# Altium footprint library Metric_SMD.PcbLib: 185 footprints (part 1 of 12) (continued)
## BGA360_TGP [mil] "BGA360_TGP" (continued)
  round 12 smd: A5(-221,299.64) A6(-194.4,307.64) A8(-126,307.64) A10(-68.4,307.64) A13(0,307.64) A16(57.6,307.64) A18(126,307.64) A20(183.6,307.64) AA1(-299.64,-221) AA2(-272.08,-221) AA3(-244.52,-221) AB4(-220.5,-235.52) AB6(-189,-232.08) AB7(-157.5,-235.52) AB8(-107.92,-238.84) AB10(-63,-232.08) AB11(-31.5,-235.52) AB13(0,-224.96) AB15(31.5,-235.52) AB16(63,-232.08) AB17(103.2,-236.81) AB19(157.5,-235.52) AB20(189,-232.08) AB22(235.52,-220.5) AB23(263.08,-220) AB24(290.64,-217.8) AC2(-280.08,-252) AC3(-252,-252.52) AC4(-220,-263.08) AC7(-157.5,-263.08) AC8(-131.65,-252.93) AC9(-94,-263.08) AC11(-31.5,-263.08) AC13(0,-252.52) AC15(32,-263.08) AC17(94.5,-263.08) AC18(126,-252.52) AC19(158,-263.08) AC21(221,-244.52) AC23(252.52,-252) AC24(280.08,-252) AD3(-252,-280.08) AD4(-217.8,-290.64) AD6(-183.6,-280.08) AD7(-157.5,-290.64) AD8(-126,-280.08) AD9(-91.8,-290.64) AD10(-57.6,-280.08) AD11(-31.5,-290.64) AD13(0,-280.08) AD15(34.2,-290.64) AD16(68.4,-280.08) AD17(94.5,-290.64) AD18(126,-280.08) AD19(160.2,-290.64) AD20(194.4,-280.08) AD21(221,-272.08) AD23(252,-280.08) AE6(-183.6,-307.64) AE8(-126,-307.64) AE10(-57.6,-307.64) AE13(0,-307.64) AE16(68.4,-307.64) AE18(126,-307.64) AE20(194.4,-307.64) AE21(221,-299.64) B3(-252,280.08) B5(-221,272.08) B6(-194.4,280.08) B7(-160.2,290.64) B8(-126,280.08) B9(-94.5,290.64) B10(-68.4,280.08) B11(-34.2,290.64) B13(0,280.08) B15(31.5,290.64) B16(57.6,280.08) B17(91.8,290.64) B18(126,280.08) B19(157.5,290.64) B20(183.6,280.08) B22(217.8,290.64) B23(252,280.08) C2(-280.08,252) C3(-252.52,252) C5(-221,244.52) C7(-158,263.08) C8(-126,252.52) C9(-94.5,263.08) C11(-32,263.08) C13(0,252.52) C15(31.5,263.08) C17(94,263.08) C18(131.65,252.93) C19(157.5,263.08) C22(220,263.08) C23(252,252.52) C24(280.08,252) D2(-290.64,217.8) D3(-263.08,220) D4(-235.52,220.5) D6(-189,232.08) D7(-157.5,235.52) D9(-103.2,236.81) D10(-63,232.08) D11(-31.5,235.52) D15(31.5,235.52) D16(63,232.08) D18(107.92,238.84) D19(157.5,235.52) D20(189,232.08) D22(220.5,235.52) E23(244.52,221) E24(272.08,221) E25(299.64,221) F1(-307.64,183.6) F2(-280.08,183.6) F4(-232.08,189) F22(232.08,189) F24(280.08,194.4) F25(307.64,194.4) G2(-290.64,157.5) G3(-263.08,157.5) G4(-235.52,157.5) G22(235.52,157.5) G23(263.08,158) G24(290.64,160.2) H1(-307.64,126) H2(-280.08,126) H3(-252.93,131.65) H4(-238.84,107.92) H23(252.52,126) H24(280.08,126) H25(307.64,126) J2(-290.64,91.8) J3(-263.08,94) J22(236.81,103.2) J23(263.08,94.5) J24(290.64,94.5) K1(-307.64,57.6) K2(-280.08,57.6) K4(-232.08,63) K22(232.08,63) K24(280.08,68.4) K25(307.64,68.4) L2(-290.64,31.5) L3(-263.08,31.5) L4(-235.52,31.5) L22(235.52,31.5) L23(263.08,32) L24(290.64,34.2) N1(-307.64,0) N2(-280.08,0) N3(-252.52,0) N4(-224.96,0) N22(224.96,0) N23(252.52,0) N24(280.08,0) N25(307.64,0) R2(-290.64,-34.2) R3(-263.08,-32) R4(-235.52,-31.5) R22(235.52,-31.5) R23(263.08,-31.5) R24(290.64,-31.5) T1(-307.64,-68.4) T2(-280.08,-68.4) T4(-232.08,-63) T22(232.08,-63) T24(280.08,-57.6) T25(307.64,-57.6) U2(-290.64,-94.5) U3(-263.08,-94.5) U4(-236.81,-103.2) U23(263.08,-94) U24(290.64,-91.8) V1(-307.64,-126) V2(-280.08,-126) V3(-252.52,-126) V22(238.84,-107.92) V23(252.93,-131.65) V24(280.08,-126) V25(307.64,-126) W2(-290.64,-160.2) W3(-263.08,-158) W4(-235.52,-157.5) W22(235.52,-157.5) W23(263.08,-157.5) W24(290.64,-157.5) Y1(-307.64,-194.4) Y2(-280.08,-194.4) Y4(-232.08,-189) Y22(232.08,-189) Y24(280.08,-183.6) Y25(307.64,-183.6)
Top Overlay:
  circle w1: c-347.24,346.54 r5
  circle w1: c-347.24,346.54 r10
  circle w1: c-347.24,346.54 r15
  lines w1: -335.5,-335.5 -335.5,305.5 -305.5,335.5 335.5,335.5 335.5,-335.5 -335.5,-335.5
3D body: height 39.37, standoff 3.94, extent -334.65,-338.58 334.65,334.65
3D body: height 78.74, standoff 39.37, extent -220.47,-248.2 232.28,232.25

## BGA484/1.0_22*22 [mm] "BGA, 484-Leads, Body 23.0x23.0mm,  Pitch 1.00mm"
height 2.44
pads (484):
  round 0.51 smd: A1(-10.5,10.5) A2(-9.5,10.5) A3(-8.5,10.5) A4(-7.5,10.5) A5(-6.5,10.5) A6(-5.5,10.5) A7(-4.5,10.5) A8(-3.5,10.5) A9(-2.5,10.5) A10(-1.5,10.5) A11(-0.5,10.5) A12(0.5,10.5) A13(1.5,10.5) A14(2.5,10.5) A15(3.5,10.5) A16(4.5,10.5) A17(5.5,10.5) A18(6.5,10.5) A19(7.5,10.5) A20(8.5,10.5) A21(9.5,10.5) A22(10.5,10.5) AA1(-10.5,-9.5) AA2(-9.5,-9.5) AA3(-8.5,-9.5) AA4(-7.5,-9.5) AA5(-6.5,-9.5) AA6(-5.5,-9.5) AA7(-4.5,-9.5) AA8(-3.5,-9.5) AA9(-2.5,-9.5) AA10(-1.5,-9.5) AA11(-0.5,-9.5) AA12(0.5,-9.5) AA13(1.5,-9.5) AA14(2.5,-9.5) AA15(3.5,-9.5) AA16(4.5,-9.5) AA17(5.5,-9.5) AA18(6.5,-9.5) AA19(7.5,-9.5) AA20(8.5,-9.5) AA21(9.5,-9.5) AA22(10.5,-9.5) AB1(-10.5,-10.5) AB2(-9.5,-10.5) AB3(-8.5,-10.5) AB4(-7.5,-10.5) AB5(-6.5,-10.5) AB6(-5.5,-10.5) AB7(-4.5,-10.5) AB8(-3.5,-10.5) AB9(-2.5,-10.5) AB10(-1.5,-10.5) AB11(-0.5,-10.5) AB12(0.5,-10.5) AB13(1.5,-10.5) AB14(2.5,-10.5) AB15(3.5,-10.5) AB16(4.5,-10.5) AB17(5.5,-10.5) AB18(6.5,-10.5) AB19(7.5,-10.5) AB20(8.5,-10.5) AB21(9.5,-10.5) AB22(10.5,-10.5) B1(-10.5,9.5) B2(-9.5,9.5) B3(-8.5,9.5) B4(-7.5,9.5) B5(-6.5,9.5) B6(-5.5,9.5) B7(-4.5,9.5) B8(-3.5,9.5) B9(-2.5,9.5) B10(-1.5,9.5) B11(-0.5,9.5) B12(0.5,9.5) B13(1.5,9.5) B14(2.5,9.5) B15(3.5,9.5) B16(4.5,9.5) B17(5.5,9.5) B18(6.5,9.5) B19(7.5,9.5) B20(8.5,9.5) B21(9.5,9.5) B22(10.5,9.5) C1(-10.5,8.5) C2(-9.5,8.5) C3(-8.5,8.5) C4(-7.5,8.5) C5(-6.5,8.5) C6(-5.5,8.5) C7(-4.5,8.5) C8(-3.5,8.5) C9(-2.5,8.5) C10(-1.5,8.5) C11(-0.5,8.5) C12(0.5,8.5) C13(1.5,8.5) C14(2.5,8.5) C15(3.5,8.5) C16(4.5,8.5) C17(5.5,8.5) C18(6.5,8.5) C19(7.5,8.5) C20(8.5,8.5) C21(9.5,8.5) C22(10.5,8.5) D1(-10.5,7.5) D2(-9.5,7.5) D3(-8.5,7.5) D4(-7.5,7.5) D5(-6.5,7.5) D6(-5.5,7.5) D7(-4.5,7.5) D8(-3.5,7.5) D9(-2.5,7.5) D10(-1.5,7.5) D11(-0.5,7.5) D12(0.5,7.5) D13(1.5,7.5) D14(2.5,7.5) D15(3.5,7.5) D16(4.5,7.5) D17(5.5,7.5) D18(6.5,7.5) D19(7.5,7.5) D20(8.5,7.5) D21(9.5,7.5) D22(10.5,7.5) E1(-10.5,6.5) E2(-9.5,6.5) E3(-8.5,6.5) E4(-7.5,6.5) E5(-6.5,6.5) E6(-5.5,6.5) E7(-4.5,6.5) E8(-3.5,6.5) E9(-2.5,6.5) E10(-1.5,6.5) E11(-0.5,6.5) E12(0.5,6.5) E13(1.5,6.5) E14(2.5,6.5) E15(3.5,6.5) E16(4.5,6.5) E17(5.5,6.5) E18(6.5,6.5) E19(7.5,6.5) E20(8.5,6.5) E21(9.5,6.5) E22(10.5,6.5) F1(-10.5,5.5) F2(-9.5,5.5) F3(-8.5,5.5) F4(-7.5,5.5) F5(-6.5,5.5) F6(-5.5,5.5) F7(-4.5,5.5) F8(-3.5,5.5) F9(-2.5,5.5) F10(-1.5,5.5) F11(-0.5,5.5) F12(0.5,5.5) F13(1.5,5.5) F14(2.5,5.5) F15(3.5,5.5) F16(4.5,5.5) F17(5.5,5.5) F18(6.5,5.5) F19(7.5,5.5) F20(8.5,5.5) F21(9.5,5.5) F22(10.5,5.5) G1(-10.5,4.5) G2(-9.5,4.5) G3(-8.5,4.5) G4(-7.5,4.5) G5(-6.5,4.5) G6(-5.5,4.5) G7(-4.5,4.5) G8(-3.5,4.5) G9(-2.5,4.5) G10(-1.5,4.5) G11(-0.5,4.5) G12(0.5,4.5) G13(1.5,4.5) G14(2.5,4.5) G15(3.5,4.5) G16(4.5,4.5) G17(5.5,4.5) G18(6.5,4.5) G19(7.5,4.5) G20(8.5,4.5) G21(9.5,4.5) G22(10.5,4.5) H1(-10.5,3.5) H2(-9.5,3.5) H3(-8.5,3.5) H4(-7.5,3.5) H5(-6.5,3.5) H6(-5.5,3.5) H7(-4.5,3.5) H8(-3.5,3.5) H9(-2.5,3.5) H10(-1.5,3.5) H11(-0.5,3.5) H12(0.5,3.5) H13(1.5,3.5) H14(2.5,3.5) H15(3.5,3.5) H16(4.5,3.5) H17(5.5,3.5) H18(6.5,3.5) H19(7.5,3.5) H20(8.5,3.5) H21(9.5,3.5) H22(10.5,3.5) J1(-10.5,2.5) J2(-9.5,2.5) J3(-8.5,2.5) J4(-7.5,2.5) J5(-6.5,2.5) J6(-5.5,2.5) J7(-4.5,2.5) J8(-3.5,2.5) J9(-2.5,2.5) J10(-1.5,2.5) J11(-0.5,2.5) J12(0.5,2.5) J13(1.5,2.5) J14(2.5,2.5) J15(3.5,2.5) J16(4.5,2.5) J17(5.5,2.5) J18(6.5,2.5) J19(7.5,2.5) J20(8.5,2.5) J21(9.5,2.5) J22(10.5,2.5) K1(-10.5,1.5) K2(-9.5,1.5) K3(-8.5,1.5) K4(-7.5,1.5) K5(-6.5,1.5) K6(-5.5,1.5) K7(-4.5,1.5) K8(-3.5,1.5) K9(-2.5,1.5) K10(-1.5,1.5) K11(-0.5,1.5) K12(0.5,1.5) K13(1.5,1.5) K14(2.5,1.5) K15(3.5,1.5) K16(4.5,1.5) K17(5.5,1.5) K18(6.5,1.5) K19(7.5,1.5) K20(8.5,1.5) K21(9.5,1.5) K22(10.5,1.5) L1(-10.5,0.5) L2(-9.5,0.5) L3(-8.5,0.5) L4(-7.5,0.5) L5(-6.5,0.5) L6(-5.5,0.5) L7(-4.5,0.5) L8(-3.5,0.5) L9(-2.5,0.5) L10(-1.5,0.5) L11(-0.5,0.5) L12(0.5,0.5) L13(1.5,0.5) L14(2.5,0.5) L15(3.5,0.5) L16(4.5,0.5) L17(5.5,0.5) L18(6.5,0.5) L19(7.5,0.5) L20(8.5,0.5) L21(9.5,0.5) L22(10.5,0.5) M1(-10.5,-0.5) M2(-9.5,-0.5) M3(-8.5,-0.5) M4(-7.5,-0.5) M5(-6.5,-0.5) M6(-5.5,-0.5) M7(-4.5,-0.5) M8(-3.5,-0.5) M9(-2.5,-0.5) M10(-1.5,-0.5) M11(-0.5,-0.5) M12(0.5,-0.5) M13(1.5,-0.5) M14(2.5,-0.5) M15(3.5,-0.5) M16(4.5,-0.5) M17(5.5,-0.5) M18(6.5,-0.5) M19(7.5,-0.5) M20(8.5,-0.5) M21(9.5,-0.5) M22(10.5,-0.5) N1(-10.5,-1.5) N2(-9.5,-1.5) N3(-8.5,-1.5) N4(-7.5,-1.5) N5(-6.5,-1.5) N6(-5.5,-1.5) N7(-4.5,-1.5) N8(-3.5,-1.5) N9(-2.5,-1.5) N10(-1.5,-1.5) N11(-0.5,-1.5) N12(0.5,-1.5) N13(1.5,-1.5) N14(2.5,-1.5) N15(3.5,-1.5) N16(4.5,-1.5) N17(5.5,-1.5) N18(6.5,-1.5) N19(7.5,-1.5) N20(8.5,-1.5) N21(9.5,-1.5) N22(10.5,-1.5) P1(-10.5,-2.5) P2(-9.5,-2.5) P3(-8.5,-2.5) P4(-7.5,-2.5) P5(-6.5,-2.5) P6(-5.5,-2.5) P7(-4.5,-2.5) P8(-3.5,-2.5) P9(-2.5,-2.5) P10(-1.5,-2.5) P11(-0.5,-2.5) P12(0.5,-2.5) P13(1.5,-2.5) P14(2.5,-2.5) P15(3.5,-2.5) P16(4.5,-2.5) P17(5.5,-2.5) P18(6.5,-2.5) P19(7.5,-2.5) P20(8.5,-2.5) P21(9.5,-2.5) P22(10.5,-2.5) R1(-10.5,-3.5) R2(-9.5,-3.5) R3(-8.5,-3.5) R4(-7.5,-3.5) R5(-6.5,-3.5) R6(-5.5,-3.5) R7(-4.5,-3.5) R8(-3.5,-3.5) R9(-2.5,-3.5) R10(-1.5,-3.5) R11(-0.5,-3.5) R12(0.5,-3.5) R13(1.5,-3.5) R14(2.5,-3.5) R15(3.5,-3.5) R16(4.5,-3.5) R17(5.5,-3.5) R18(6.5,-3.5) R19(7.5,-3.5) R20(8.5,-3.5) R21(9.5,-3.5) R22(10.5,-3.5) T1(-10.5,-4.5) T2(-9.5,-4.5) T3(-8.5,-4.5) T4(-7.5,-4.5) T5(-6.5,-4.5) T6(-5.5,-4.5) T7(-4.5,-4.5) T8(-3.5,-4.5) T9(-2.5,-4.5) T10(-1.5,-4.5) T11(-0.5,-4.5) T12(0.5,-4.5) T13(1.5,-4.5) T14(2.5,-4.5) T15(3.5,-4.5) T16(4.5,-4.5) T17(5.5,-4.5) T18(6.5,-4.5) T19(7.5,-4.5) T20(8.5,-4.5) T21(9.5,-4.5) T22(10.5,-4.5) U1(-10.5,-5.5) U2(-9.5,-5.5) U3(-8.5,-5.5) U4(-7.5,-5.5) U5(-6.5,-5.5) U6(-5.5,-5.5) U7(-4.5,-5.5) U8(-3.5,-5.5) U9(-2.5,-5.5) U10(-1.5,-5.5) U11(-0.5,-5.5) U12(0.5,-5.5) U13(1.5,-5.5) U14(2.5,-5.5) U15(3.5,-5.5) U16(4.5,-5.5) U17(5.5,-5.5) U18(6.5,-5.5) U19(7.5,-5.5) U20(8.5,-5.5) U21(9.5,-5.5) U22(10.5,-5.5) V1(-10.5,-6.5) V2(-9.5,-6.5) V3(-8.5,-6.5) V4(-7.5,-6.5) V5(-6.5,-6.5) V6(-5.5,-6.5) V7(-4.5,-6.5) V8(-3.5,-6.5) V9(-2.5,-6.5) V10(-1.5,-6.5) V11(-0.5,-6.5) V12(0.5,-6.5) V13(1.5,-6.5) V14(2.5,-6.5) V15(3.5,-6.5) V16(4.5,-6.5) V17(5.5,-6.5) V18(6.5,-6.5) V19(7.5,-6.5) V20(8.5,-6.5) V21(9.5,-6.5) V22(10.5,-6.5) W1(-10.5,-7.5) W2(-9.5,-7.5) W3(-8.5,-7.5) W4(-7.5,-7.5) W5(-6.5,-7.5) W6(-5.5,-7.5) W7(-4.5,-7.5) W8(-3.5,-7.5) W9(-2.5,-7.5) W10(-1.5,-7.5) W11(-0.5,-7.5) W12(0.5,-7.5) W13(1.5,-7.5) W14(2.5,-7.5) W15(3.5,-7.5) W16(4.5,-7.5) W17(5.5,-7.5) W18(6.5,-7.5) W19(7.5,-7.5) W20(8.5,-7.5) W21(9.5,-7.5) W22(10.5,-7.5) Y1(-10.5,-8.5) Y2(-9.5,-8.5) Y3(-8.5,-8.5) Y4(-7.5,-8.5) Y5(-6.5,-8.5) Y6(-5.5,-8.5) Y7(-4.5,-8.5) Y8(-3.5,-8.5) Y9(-2.5,-8.5) Y10(-1.5,-8.5) Y11(-0.5,-8.5) Y12(0.5,-8.5) Y13(1.5,-8.5) Y14(2.5,-8.5) Y15(3.5,-8.5) Y16(4.5,-8.5) Y17(5.5,-8.5) Y18(6.5,-8.5) Y19(7.5,-8.5) Y20(8.5,-8.5) Y21(9.5,-8.5) Y22(10.5,-8.5)
Top Overlay:
  circle w0.25: c-12.15,10.5 r0.125
  region: -10.5,11.5 -11.5,10.5 -11.5,11.5
  lines w0.2: -11.5,10.5 -10.5,11.5 ; -11.5,-11.5 11.5,-11.5 11.5,11.5 -11.5,11.5 -11.5,-11.5
Mechanical 13:
  lines w0.1: -11.5,-11.5 11.5,-11.5 11.5,11.5 -11.5,11.5 -11.5,-11.5
Mechanical 15:
  lines w0.1: -0.5,0 0.5,0 ; 0,-0.5 0,0.5 ; -12.5,-12.5 12.5,-12.5 12.5,12.5 -12.5,12.5 -12.5,-12.5
3D body "User Library-BGA484.STEP": height 3.1, standoff 0, extent -11.597,-11.6 11.403,11.4

## BGA559_CEDARVIEW [mil] "BGA559_CEDARVIEW"
pads (559):
  round 16 smd: A3(-350.51,406.07) A4(-320.4,406.07) A27(309.6,406.07) A29(347.71,406.07) AG31(406.07,-309.6) AH1(-406.07,-320.4) AJ1(-406.07,-348.15) AJ2(-378.51,-350.51) AJ30(378.51,-350.51) AJ31(406.07,-347.71) AK1(-406.07,-375.71) AK2(-378.51,-378.51) AK3(-350.51,-378.51) AK29(350.51,-378.51) AK30(378.51,-378.51) AK31(406.07,-375.71) AL2(-375.71,-406.07) AL3(-347.71,-406.07) AL5(-309.6,-406.07) AL28(317.6,-406.07) AL29(347.71,-406.07) AL30(375.71,-406.07) B2(-378.51,378.51) B3(-350.51,378.51) B4(-320.4,378.51) B29(350.51,378.51) B31(406.07,375.71) C1(-406.07,350.51) C2(-378.51,350.51) C5(-310.67,339.71) C30(378.51,350.51) C31(406.07,347.71) D31(406.07,317.6) E1(-406.07,309.6) E2(-378.51,309.6)
  round 12 smd: A7(-252,406.07) A9(-194.4,406.07) A11(-126,406.07) A13(-68.4,406.07) A16(0,406.07) A19(57.6,406.07) A21(126,406.07) A23(183.6,406.07) A25(252,406.07) AA1(-406.07,-126) AA2(-378.51,-126) AA3(-350.95,-126) AA29(350.95,-126) AA30(378.51,-126) AA31(406.07,-126) AB2(-389.07,-160.2) AB3(-361.51,-158) AB4(-333.95,-157.5) AB28(333.95,-157.5) AB29(361.51,-157.5) AB30(389.07,-157.5) AC1(-406.07,-194.4) AC2(-378.51,-194.4) AC4(-330.51,-189) AC28(330.51,-189) AC30(378.51,-183.6) AC31(406.07,-183.6) AD2(-389.07,-220.5) AD3(-361.51,-220.5) AD4(-333.95,-220.5) AD28(333.95,-220.5) AD29(361.51,-220) AD30(389.07,-217.8) AE1(-406.07,-252) AE2(-378.51,-252) AE3(-350.95,-252) AE29(350.95,-252) AE30(378.51,-252) AE31(406.07,-252) AF3(-361.51,-284) AF4(-333.95,-283.7) AF28(333.95,-283.5) AF29(361.51,-283.5) AF30(389.07,-283.5) AG2(-389.07,-286.2) AG3(-339.71,-310.67) AG30(378.51,-309.6) AH2(-378.51,-320.4) AH4(-315,-330.51) AH6(-283.5,-333.95) AH8(-220.5,-333.95) AH9(-189,-330.51) AH10(-157.5,-333.95) AH12(-94.5,-333.95) AH13(-63,-330.51) AH14(-31.5,-333.95) AH18(31.5,-333.95) AH19(63,-330.51) AH20(94.5,-333.95) AH22(157.5,-333.95) AH23(189,-330.51) AH24(220.5,-333.95) AH26(283.7,-333.95) AH28(330.51,-315) AJ3(-346,-350.95) AJ6(-283.5,-361.51) AJ7(-252,-350.95) AJ8(-220,-361.51) AJ10(-157.5,-361.51) AJ11(-126,-350.95) AJ12(-94,-361.51) AJ14(-31.5,-361.51) AJ16(0,-350.95) AJ18(32,-361.51) AJ20(94.5,-361.51) AJ21(126,-350.95) AJ22(158,-361.51) AJ24(220.5,-361.51) AJ25(252,-350.95) AJ26(284,-361.51) AJ29(350.95,-346) AK5(-309.6,-378.51) AK6(-283.5,-389.07) AK7(-252,-378.51) AK8(-217.8,-389.07) AK9(-183.6,-378.51) AK10(-157.5,-389.07) AK11(-126,-378.51) AK12(-91.8,-389.07) AK13(-57.6,-378.51) AK14(-31.5,-389.07) AK16(0,-378.51) AK18(34.2,-389.07) AK19(68.4,-378.51) AK20(94.5,-389.07) AK21(126,-378.51) AK22(160.2,-389.07) AK23(194.4,-378.51) AK24(220.5,-389.07) AK25(252,-378.51) AK27(286.2,-389.07) AK28(320.4,-378.51) AL7(-252,-406.07) AL9(-183.6,-406.07) AL11(-126,-406.07) AL13(-57.6,-406.07) AL16(0,-406.07) AL19(68.4,-406.07) AL21(126,-406.07) AL23(194.4,-406.07) AL25(252,-406.07) B5(-286.2,389.07) B7(-252,378.51) B8(-220.5,389.07) B9(-194.4,378.51) B10(-160.2,389.07) B11(-126,378.51) B12(-94.5,389.07) B13(-68.4,378.51) B14(-34.2,389.07) B16(0,378.51) B18(31.5,389.07) B19(57.6,378.51) B20(91.8,389.07) B21(126,378.51) B22(157.5,389.07) B23(183.6,378.51) B24(217.8,389.07) B25(252,378.51) B26(283.5,389.07) B27(309.6,378.51) C3(-350.95,346) C6(-284,361.51) C7(-252,350.95) C8(-220.5,361.51) C10(-158,361.51) C11(-126,350.95) C12(-94.5,361.51) C14(-32,361.51) C16(0,350.95) C18(31.5,361.51) C20(94,361.51) C21(126,350.95) C22(157.5,361.51) C24(220,361.51) C25(252,350.95) C26(283.5,361.51) C29(346,350.95) D4(-330.51,315) D6(-283.7,333.95) D8(-220.5,333.95) D9(-189,330.51) D10(-157.5,333.95) D12(-94.5,333.95) D13(-63,330.51) D14(-31.5,333.95) D18(31.5,333.95) D19(63,330.51) D20(94.5,333.95) D22(157.5,333.95) D23(189,330.51) D24(220.5,333.95) D26(283.5,333.95) D28(315,330.51) D30(378.51,320.4) E29(339.71,310.67) E30(389.07,286.2) F2(-389.07,283.5) F3(-361.51,283.5) F4(-333.95,283.5) F28(333.95,283.7) F29(361.51,284) G1(-406.07,252) G2(-378.51,252) G3(-350.95,252) G29(350.95,252) G30(378.51,252) G31(406.07,252) H2(-389.07,217.8) H3(-361.51,220) H4(-333.95,220.5) H28(333.95,220.5) H29(361.51,220.5) H30(389.07,220.5) J1(-406.07,183.6) J2(-378.51,183.6) J4(-330.51,189) J28(330.51,189) J30(378.51,194.4) J31(406.07,194.4) K2(-389.07,157.5) K3(-361.51,157.5) K4(-333.95,157.5) K28(333.95,157.5) K29(361.51,158) K30(389.07,160.2) L1(-406.07,126) L2(-378.51,126) L3(-350.95,126) L29(350.95,126) L30(378.51,126) L31(406.07,126) M2(-389.07,91.8) M3(-361.51,94) M4(-333.95,94.5) M28(333.95,94.5) M29(361.51,94.5) M30(389.07,94.5) N1(-406.07,57.6) N2(-378.51,57.6) N4(-330.51,63) N28(330.51,63) N30(378.51,68.4) N31(406.07,68.4) P2(-389.07,31.5) P3(-361.51,31.5) P4(-333.95,31.5) P28(333.95,31.5) P29(361.51,32) P30(389.07,34.2) T1(-406.07,0) T2(-378.51,0) T3(-350.95,0) T29(350.95,0) T30(378.51,0) T31(406.07,0) V2(-389.07,-34.2) V3(-361.51,-32) V4(-333.95,-31.5) V28(333.95,-31.5) V29(361.51,-31.5) V30(389.07,-31.5) W1(-406.07,-68.4) W2(-378.51,-68.4) W4(-330.51,-63) W28(330.51,-63) W30(378.51,-57.6) W31(406.07,-57.6) Y2(-389.07,-94.5) Y3(-361.51,-94.5) Y4(-333.95,-94.5) Y28(333.95,-94.5) Y29(361.51,-94) Y30(389.07,-91.8)
  round 22 smd: A30(375.71,406.07) B30(378.51,378.51)
  round 14 smd: AA5(-302,-116.5) AA6(-272,-116.5) AA7(-242,-116.5) AA8(-212,-116.5) AA9(-182,-116.5) AA10(-152,-116.5) AA11(-108,-108) AA13(-72,-108) AA14(-36,-108) AA16(0,-108) AA18(36,-108) AA19(72,-108) AA21(108,-108) AA22(152,-116.5) AA23(182,-116.5) AA24(212,-116.5) AA25(242,-116.5) AA26(272,-116.5) AA27(302,-116.5) AB5(-302,-162.5) AB6(-272,-162.5) AB7(-242,-162.5) AB8(-212,-162.5) AB9(-182,-162.5) AB11(-116.5,-152) AB13(-70.5,-152) AB15(-24.5,-152) AB17(24.5,-152) AB19(70.5,-152) AB21(116.5,-152) AB23(182,-162.5) AB24(212,-162.5) AB25(242,-162.5) AB26(272,-162.5) AB27(302,-162.5) AC10(-162.5,-182) AC11(-116.5,-182) AC13(-70.5,-182) AC15(-24.5,-182) AC17(24.5,-182) AC19(70.5,-182) AC21(116.5,-182) AC22(162.5,-182) AD5(-302,-208.5) AD6(-272,-208.5) AD7(-244.44,-208.5) AD8(-208.5,-212) AD10(-162.5,-212) AD11(-116.5,-212) AD13(-70.5,-212) AD15(-24.5,-212) AD17(24.5,-212) AD19(70.5,-212) AD21(116.5,-212) AD22(162.5,-212) AD24(212,-208.5) AD25(242,-208.5) AD26(272,-208.5) AD27(302,-208.5) AE5(-302,-254.5) AE8(-208.5,-242) AE10(-162.5,-242) AE11(-116.5,-242) AE13(-70.5,-242) AE15(-24.5,-242) AE17(24.5,-242) AE19(70.5,-242) AE21(116.5,-242) AE22(162.5,-242) AE24(208.5,-244.44) AE26(272,-254.5) AE27(302,-254.5) AF7(-254.5,-272) AF8(-208.5,-272) AF10(-162.5,-272) AF11(-116.5,-272) AF13(-70.5,-272) AF15(-24.5,-272) AF17(24.5,-272) AF19(70.5,-272) AF21(116.5,-272) AF22(162.5,-272) AF24(208.5,-272) AG5(-292.85,-308.02) AG7(-254.5,-302) AG8(-208.5,-302) AG10(-162.5,-302) AG11(-116.5,-302) AG13(-70.5,-302) AG15(-24.5,-302) AG17(24.5,-302) AG19(70.5,-302) AG21(116.5,-302) AG22(162.5,-302) AG24(208.5,-302) AG25(254.5,-302) AG27(308.02,-292.85) AJ27(310.67,-339.71) E5(-308.02,292.85) E7(-254.5,302) E8(-208.5,302) E10(-162.5,302) E11(-116.5,302) E13(-70.5,302) E15(-24.5,302) E17(24.5,302) E19(70.5,302) E21(116.5,302) E22(162.5,302) E24(208.5,302) E25(254.5,302) E27(292.85,308.02) F8(-208.5,272) F10(-162.5,272) F11(-116.5,272) F13(-70.5,272) F15(-24.5,272) F17(24.5,272) F19(70.5,272) F21(116.5,272) F22(162.5,272) F24(208.5,272) F25(254.5,272) G5(-302,254.5) G6(-272,254.5) G8(-208.5,244.44) G10(-162.5,242) G11(-116.5,242) G13(-70.5,242) G15(-24.5,242) G17(24.5,242) G19(70.5,242) G21(116.5,242) G22(162.5,242) G24(208.5,242) G27(302,254.5) H5(-302,208.5) H6(-272,208.5) H7(-242,208.5) H8(-212,208.5) H10(-162.5,212) H11(-116.5,212) H13(-70.5,212) H15(-24.5,212) H17(24.5,212) H19(70.5,212) H21(116.5,212) H22(162.5,212) H24(208.5,212) H25(244.44,208.5) H26(272,208.5) H27(302,208.5) J10(-162.5,182) J11(-116.5,182) J13(-70.5,182) J15(-24.5,182) J17(24.5,182) J19(70.5,182) J21(116.5,182) J22(162.5,182) K5(-302,162.5) K6(-272,162.5) K7(-242,162.5) K8(-212,162.5) K9(-182,162.5) K11(-116.5,152) K13(-70.5,152) K15(-24.5,152) K17(24.5,152) K19(70.5,152) K21(116.5,152) K23(182,162.5) K24(212,162.5) K25(242,162.5) K26(272,162.5) K27(302,162.5) L5(-302,116.5) L6(-272,116.5) L7(-242,116.5) L8(-212,116.5) L9(-182,116.5) L10(-152,116.5) L11(-108,108) L13(-72,108) L14(-36,108) L16(0,108) L18(36,108) L19(72,108) L21(108,108) L22(152,116.5) L23(182,116.5) L24(212,116.5) L25(242,116.5) L26(272,116.5) L27(302,116.5) N5(-302,70.5) N6(-272,70.5) N7(-242,70.5) N8(-212,70.5) N9(-182,70.5) N10(-152,70.5) N11(-108,72) N13(-72,72) N14(-36,72) N16(0,72) N18(36,72) N19(72,72) N21(108,72) N22(152,70.5) N23(182,70.5) N24(212,70.5) N25(242,70.5) N26(272,70.5) N27(302,70.5) P11(-108,36) P13(-72,36) P14(-36,36) P16(0,36) P18(36,36) P19(72,36) P21(108,36) R5(-302,24.5) R6(-272,24.5) R7(-242,24.5) R8(-212,24.5) R9(-182,24.5) R10(-152,24.5) R22(152,24.5) R23(182,24.5) R24(212,24.5) R25(242,24.5) R26(272,24.5) R27(302,24.5) T11(-108,0) T13(-72,0) T14(-36,0) T16(0,0) T18(36,0) T19(72,0) T21(108,0) U5(-302,-24.5) U6(-272,-24.5) U7(-242,-24.5) U8(-212,-24.5) U9(-182,-24.5) U10(-152,-24.5) U22(152,-24.5) U23(182,-24.5) U24(212,-24.5) U25(242,-24.5) U26(272,-24.5) U27(302,-24.5) V11(-108,-36) V13(-72,-36) V14(-36,-36) V16(0,-36) V18(36,-36) V19(72,-36) V21(108,-36) W5(-302,-70.5) W6(-272,-70.5) W7(-242,-70.5) W8(-212,-70.5) W9(-182,-70.5) W10(-152,-70.5) W11(-108,-72) W13(-72,-72) W14(-36,-72) W16(0,-72) W18(36,-72) W19(72,-72) W21(108,-72) W22(152,-70.5) W23(182,-70.5) W24(212,-70.5) W25(242,-70.5) W26(272,-70.5) W27(302,-70.5)
Top Overlay:
  circle w1: c-458.23,457.29 r5
  circle w1: c-458.23,457.29 r10
  circle w1: c-458.23,457.29 r15
  lines w1: -434,-434 434,-434 434,434 -434,434 -434,-434
3D body: height 78.74, standoff 39.37, extent -347.45,-353.46 326.77,340.76
3D body: height 39.37, standoff 3.94, extent -429.13,-433.07 433.07,433.07

## C2212 [mm] "2212电解, 典型100uF"
height 3.2
pads (2):
  rect 3x2.7 smd: 1(-2.2,0) 2(2.2,0)
Top Overlay:
  lines w0.2: -0.95,-1.75 -3.75,-1.75 -4.15,-1.35 -4.15,1.35 -3.75,1.75 -0.95,1.75 ; -0.3,-1.1 -0.3,1 ; 0.3,-1.1 0.3,1 ; 1,-1.75 4.05,-1.75 4.05,1.75 1,1.75

## C3015 [mil] "极性电容"
pads (2):
  rect 120x120 smd: 1(-130,0) 2(130,0)
Top Overlay:
  lines w7.87: -177.17,100 -177.56,100 ; -78.74,-100 -177.56,-100 -206.69,-70.87 -206.69,70.87 -177.56,100 ; -78.74,100 -177.56,100 ; -19.68,-49.21 -19.68,49.21 ; 19.68,-49.21 19.68,49.21 ; 80.71,-100 206.69,-100 206.69,100 80.71,100

## C3216 [mm] "A封装,极性电容, Body 3.2x1.6mm"
height 1.8
pads (2):
  rect 1.4x1.8 smd: 1(-1.45,0) 2(1.45,0)
Top Overlay:
  lines w0.15: -0.2,-0.75 -0.2,0.774 ; 0.2,-0.75 0.2,0.774
  lines w0.2: -0.762,-1.27 -2.18,-1.27 -2.5,-0.95 -2.5,0.95 -2.18,1.27 -0.762,1.27 ; 0.762,-1.27 2.45,-1.27 2.45,1.27 0.762,1.27
Mechanical 13:
  lines w0.1: -1.7,-0.9 1.7,-0.9 1.7,0.9 -1.7,0.9 -1.7,-0.9
Mechanical 15:
  lines w0.1: -0.5,0 0.5,0 ; 0,-0.5 0,0.5
3D body "User Library-CAP_TANT_3216-18_A_case.STEP": height 1.8, standoff 0, extent -1.69,-0.9 1.71,0.9

## C3225 [mm] "Chip Capacitor; Body 3.2 x 2.5 mm (LxW typ)"
height 1.35
pads (2):
  rect 1.6x2.7 smd: 1(-1.4,0) 2(1.4,0)
Top Overlay:
  lines w0.152: -0.2,-1.05 -0.2,1.05 ; 0.2,-1.05 0.2,1.05
  lines w0.2: -0.75,-1.7 -2.25,-1.7 -2.65,-1.3 -2.65,1.3 -2.25,1.7 -0.75,1.7 ; 0.774,-1.7 2.5,-1.7 2.5,1.7 0.774,1.7